# Altium footprint library ssmaster_1.PcbLib: 43 footprints (part 2 of 3)
Each footprint in its own frame and in the unit in brackets; x right, y up, seen from the top. Pads: shape width x height; smd on the part's side, far side on the other; paste and mask are expansions set on the pad; w line width, h text height; cw(c..) or ccw(c..) is an arc to the next point about the centre after c.
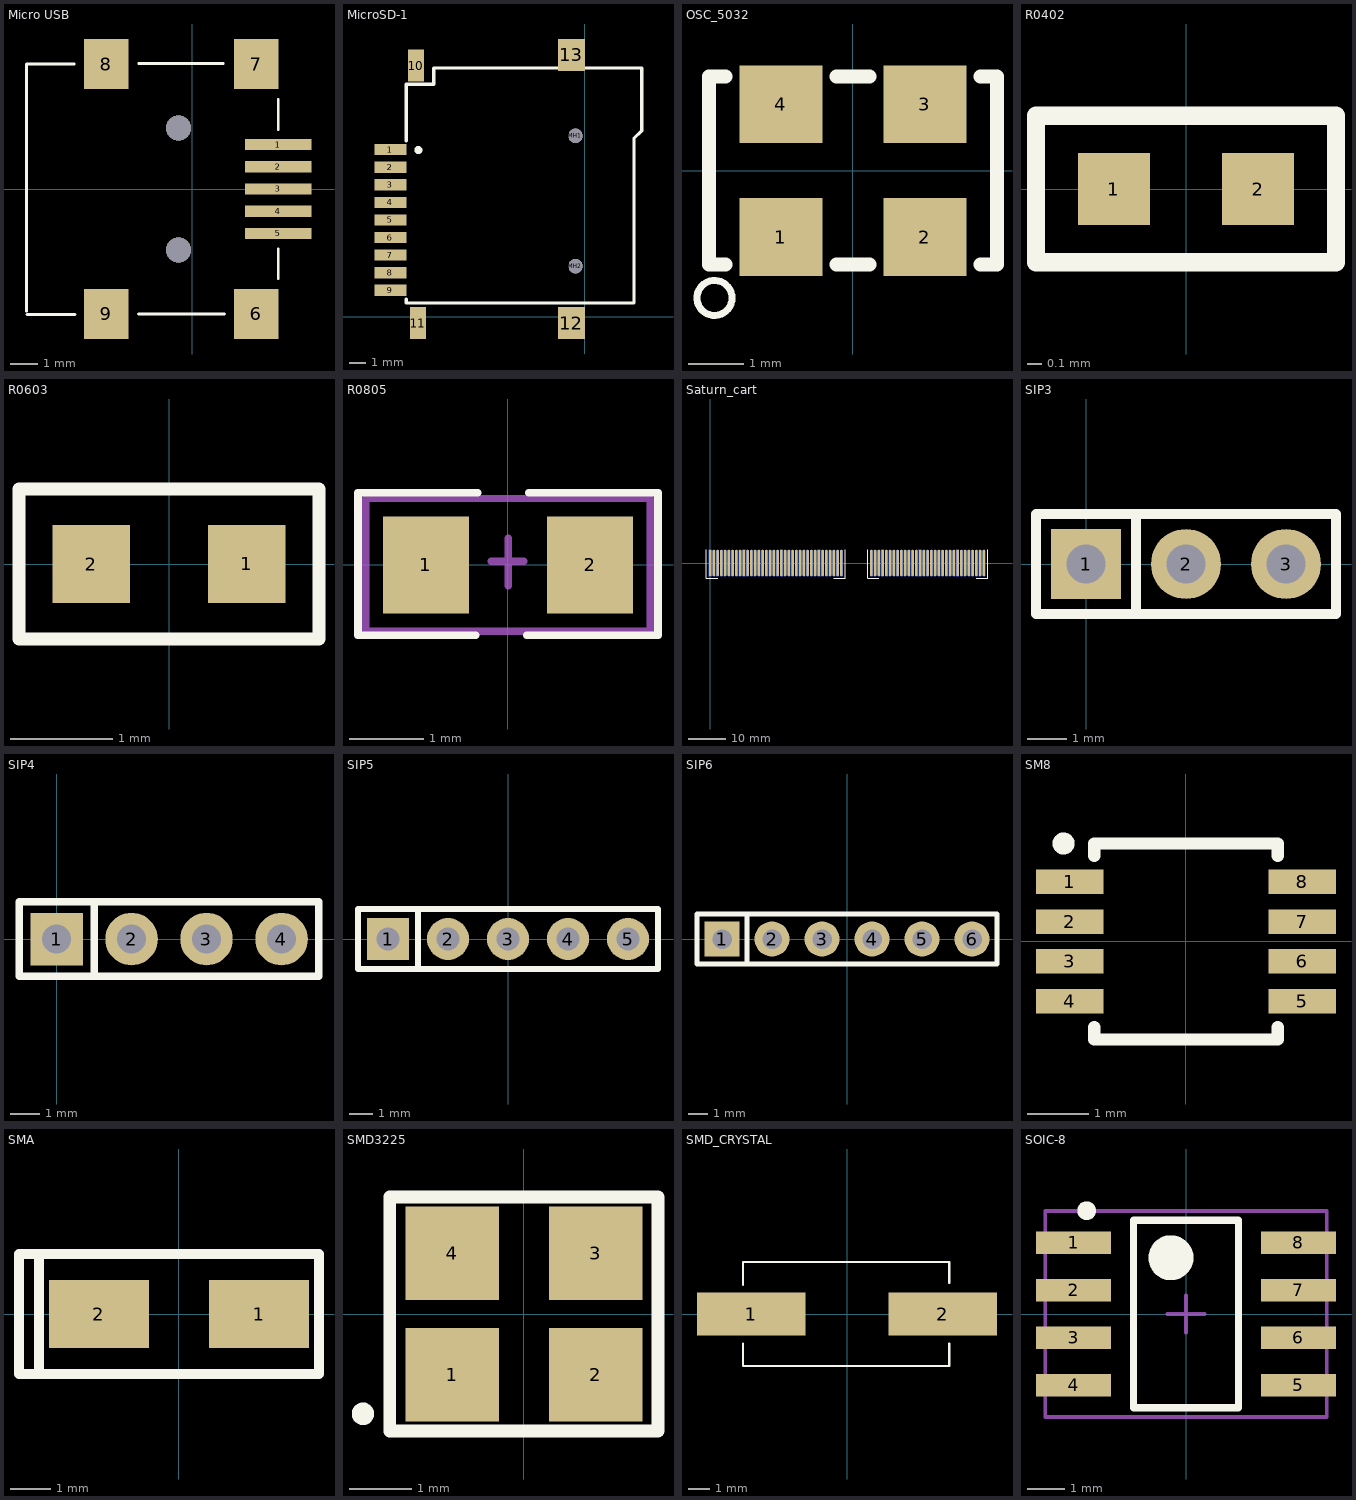
[diagram p1: the footprints below, top view; thin cyan lines are the x and y axes]

## Micro USB [mm]
pads (9):
  rect 2.4x0.4 smd: 1(3.1,1.6) 2(3.1,0.8) 3(3.1,0) 4(3.1,-0.8) 5(3.1,-1.6)
  rect 1.6x1.8 smd: 6(2.3,-4.5) 7(2.3,4.5) 8(-3.1,4.5) 9(-3.1,-4.5)
via -0.5,-2.2 diameter 0.9 hole 0.9
via -0.5,2.2 diameter 0.9 hole 0.9
Top Overlay:
  lines w0.1: -5.969,-4.4 -5.969,4.5 -4.242,4.5 ; -5.944,-4.521 -4.216,-4.521 ; -1.93,-4.496 1.168,-4.496 ; -1.92,4.521 1.118,4.521 ; 3.099,-3.226 3.099,-2.159 ; 3.099,2.134 3.099,3.226
3D body: height 3.95, standoff -1, extent -5.918,-5.325 3.282,5.375

## MicroSD-1 [mm] "MicroSD"
pads (15):
  rect 2x0.7 smd: 1(-12.167,10.439) 2(-12.167,9.339) 3(-12.167,8.239) 4(-12.167,7.139) 5(-12.167,6.039) 6(-12.167,4.939) 7(-12.167,3.839) 8(-12.167,2.739) 9(-12.167,1.639)
  rect 1x2 smd: 10(-10.566,15.697) 11(-10.439,-0.406)
  rect 1.7x2 smd: 12(-0.838,-0.406) 13(-0.838,16.358)
  round 0.9 hole 0.9: MH1(-0.584,11.303) MH2(-0.584,3.15)
Top Overlay:
  circle w0.25: c-10.412,10.414 r0.125
  lines w0.2: -11.167,1.092 -11.167,0.838 -2.54,0.838 3.073,0.838 ; -11.167,10.998 -11.167,14.529 -9.449,14.529 -9.449,15.545 -8.433,15.545 3.556,15.545 3.556,11.62 3.067,11.131 3.067,0.847
3D body: height 1.85, standoff -0.6, extent -11.816,0.127 3.434,16.127

## OSC_5032 [mm]
pads (4):
  rect 1.5x1.4 smd: 1(-1.3,-1.2) 2(1.3,-1.2) 3(1.3,1.2) 4(-1.3,1.2)
Top Overlay:
  circle w0.127: c-2.5,-2.3 r0.316
  lines w0.254: -2.3,-1.7 -2.6,-1.7 -2.6,1.7 -2.3,1.7 ; -0.3,-1.7 0.3,-1.7 ; -0.3,1.7 0.3,1.7 ; 2.3,-1.7 2.6,-1.7 2.6,1.7 2.3,1.7

## R0402 [mm]
height 0.5
pads (2):
  rect 0.5x0.5 smd: 1(-0.5,0) 2(0.5,0)
Top Overlay:
  lines w0.127: 0.229,-0.508 1.041,-0.508 ; 1.041,-0.508 1.041,0.508 -1.041,0.508 -1.041,-0.508 1.041,-0.508
3D body: height 0.5, standoff -0.01, extent -0.483,-0.255 0.517,0.255

## R0603 [mil]
height 35.04
pads (2):
  rect 30x30 smd: 1(30,0) 2(-30,0)
Top Overlay:
  lines w5: -58,-29 -58,29 58,29 58,-29 -58,-29
3D body: height 35.93, standoff 0.5, extent -31.99,-16 31,15.89

## R0805 [mm]
height 0.5
pads (2):
  rect 1.15x1.3 smd: 1(-1.1,0) 2(1.1,0)
Top Overlay:
  lines w0.102: -0.432,-0.94 -2.007,-0.94 -2.007,0.965 -0.406,0.965 ; 0.254,-0.94 2.007,-0.94 2.007,0.965 0.279,0.965
Mechanical 15:
  lines w0.1: -0.222,0.051 0.006,0.051 ; 0.006,-0.279 0.006,0.356 ; 0.006,0.025 0.006,0.051 ; 0.21,0.051 0.006,0.051 ; -1.905,-0.889 1.905,-0.889 1.905,0.889 -1.905,0.889 -1.905,-0.889
3D body: height 0.5, standoff -0.01, extent -1,-0.61 1,0.6

## Saturn_cart [mm]
pads (134):
  rect 0.7x7 smd far side: A1(0,0) A10(9,0) A20(19,0) A30(29,0) A40(46,0) A50(56,0) A60(66,0)
  oval 0.7x7 smd far side: A2(1,0) A3(2,0) A4(3,0) A5(4,0) A6(5,0) A7(6,0) A8(7,0) A9(8,0) A11(10,0) A12(11,0) A13(12,0) A14(13,0) A15(14,0) A16(15,0) A17(16,0) A18(17,0) A19(18,0) A21(20,0) A22(21,0) A23(22,0) A24(23,0) A25(24,0) A26(25,0) A27(26,0) A28(27,0) A29(28,0) A31(30,0) A32(31,0) A33(32,0) A34(33,0) A35(34,0) A36(35,0) A37(43,0) A38(44,0) A39(45,0) A41(47,0) A42(48,0) A43(49,0) A44(50,0) A45(51,0) A46(52,0) A47(53,0) A48(54,0) A49(55,0) A51(57,0) A52(58,0) A53(59,0) A54(60,0) A55(61,0) A56(62,0) A57(63,0) A58(64,0) A59(65,0) A61(67,0) A62(68,0) A63(69,0) A64(70,0) A65(71,0) A66(72,0) A67(73,0)
  rect 0.7x7 smd: B1(0,0) B10(9,0) B20(19,0) B30(29,0) B40(46,0) B50(56,0) B60(66,0)
  oval 0.7x7 smd: B2(1,0) B3(2,0) B4(3,0) B5(4,0) B6(5,0) B7(6,0) B8(7,0) B9(8,0) B11(10,0) B12(11,0) B13(12,0) B14(13,0) B15(14,0) B16(15,0) B17(16,0) B18(17,0) B19(18,0) B21(20,0) B22(21,0) B23(22,0) B24(23,0) B25(24,0) B26(25,0) B27(26,0) B28(27,0) B29(28,0) B31(30,0) B32(31,0) B33(32,0) B34(33,0) B35(34,0) B36(35,0) B37(43,0) B38(44,0) B39(45,0) B41(47,0) B42(48,0) B43(49,0) B44(50,0) B45(51,0) B46(52,0) B47(53,0) B48(54,0) B49(55,0) B51(57,0) B52(58,0) B53(59,0) B54(60,0) B55(61,0) B56(62,0) B57(63,0) B58(64,0) B59(65,0) B61(67,0) B62(68,0) B63(69,0) B64(70,0) B65(71,0) B66(72,0) B67(73,0)
Top Overlay:
  lines w0.254: -1,3.5 -1,-4 2,-4 ; 33,-4 36,-4 36,3.5 ; 42,3.5 42,-4 45,-4 ; 71,-4 74,-4 74,3.5

## SIP3 [mil]
pads (3):
  rect 70x70 hole 39: 1(0,0)
  round 70 hole 39: 2(100,0) 3(200,0)
Top Overlay:
  lines w10: 50,-50 50,50 ; -50,-50 -50,50 250,50 250,-50 -50,-50

## SIP4 [mil]
pads (4):
  rect 70x70 hole 39: 1(0,0)
  round 70 hole 39: 2(100,0) 3(200,0) 4(300,0)
Top Overlay:
  lines w10: 50,-50 50,50 ; -50,-50 350,-50 350,50 -50,50 -50,-50

## SIP5 [mil]
pads (5):
  rect 70x70 hole 39: 1(-200,0)
  round 70 hole 39: 2(-100,0) 3(0,0) 4(100,0) 5(200,0)
Top Overlay:
  lines w10: -150,-50 -150,50 ; -250,-50 250,-50 250,50 -250,50 -250,-50

## SIP6 [mil]
pads (6):
  rect 70x70 hole 39: 1(-250,0)
  round 70 hole 39: 2(-150,0) 3(-50,0) 4(50,0) 5(150,0) 6(250,0)
Top Overlay:
  lines w10: -200,-50 -200,50 ; -300,-50 300,-50 300,50 -300,50 -300,-50

## SM8 [mm]
pads (8):
  rect 1.1x0.4 smd: 1(-1.9,0.975) 2(-1.9,0.325) 3(-1.9,-0.325) 4(-1.9,-0.975) 5(1.9,-0.975) 6(1.9,-0.325) 7(1.9,0.325) 8(1.9,0.975)
Top Overlay:
  circle w0.2: c-2,1.6 r0.08
  lines w0.2: -1.5,-1.4 -1.5,-1.6 1.5,-1.6 1.5,-1.4 ; -1.5,1.4 -1.5,1.6 1.5,1.6 1.5,1.4

## SMA [mm]
pads (2):
  rect 2.5x1.7 smd: 1(2,0) 2(-2,0)
Top Overlay:
  lines w0.254: -3.5,-1.5 -4,-1.5 -4,1.5 -3.5,1.5 ; -3.5,-1.5 -3.5,1.5 ; -3.5,-1.5 3.5,-1.5 3.5,1.5 -3.5,1.5

## SMD3225 [mm]
pads (4):
  rect 1.5x1.5 smd: 1(-1.15,-0.975) 2(1.15,-0.975) 3(1.15,0.975) 4(-1.15,0.975)
Top Overlay:
  circle w0.2: c-2.58,-1.6 r0.08
  lines w0.203: -2.15,-1.875 -2.15,1.875 2.15,1.875 2.15,-1.875 -2.15,-1.875
3D body: height 0.61, standoff 0, extent -1.6,-1.25 1.6,1.25

## SMD_CRYSTAL [mm]
pads (2):
  rect 5x2 smd: 1(-4.407,0) 2(4.407,0)
Top Overlay:
  lines w0.1: -4.788,-1.372 -4.788,-2.4 4.712,-2.4 4.712,-1.372 ; -4.788,1.346 -4.788,2.4 4.712,2.4 4.712,1.422
3D body: height 4, standoff 0, extent -6.751,-2.462 6.649,2.438

## SOIC-8 [mm]
height 1.4
pads (8):
  rect 2x0.6 smd: 1(-3,1.905) 2(-3,0.635) 3(-3,-0.635) 4(-3,-1.905) 5(3,-1.905) 6(3,-0.635) 7(3,0.635) 8(3,1.905)
Top Overlay:
  circle w0.6: c-0.4,1.5 r0.3
  circle w0.25: c-2.65,2.755 r0.125
  lines w0.2: -1.4,-2.5 1.4,-2.5 1.4,2.5 -1.4,2.5 -1.4,-2.5
Mechanical 15:
  lines w0.1: -0.5,0 0.5,0 ; 0,-0.5 0,0.5 ; -3.75,-2.75 3.75,-2.75 3.75,2.75 -3.75,2.75 -3.75,-2.75
3D body: height 1.51, standoff 0, extent -3.05,-2.438 3.05,2.462